# Altium footprint library ZYF_IC.PcbLib: 32 footprints (part 2 of 2)
Each footprint in its own frame and in the unit in brackets; x right, y up, seen from the top. Pads: shape width x height; smd on the part's side, far side on the other; paste and mask are expansions set on the pad; w line width, h text height; cw(c..) or ccw(c..) is an arc to the next point about the centre after c.
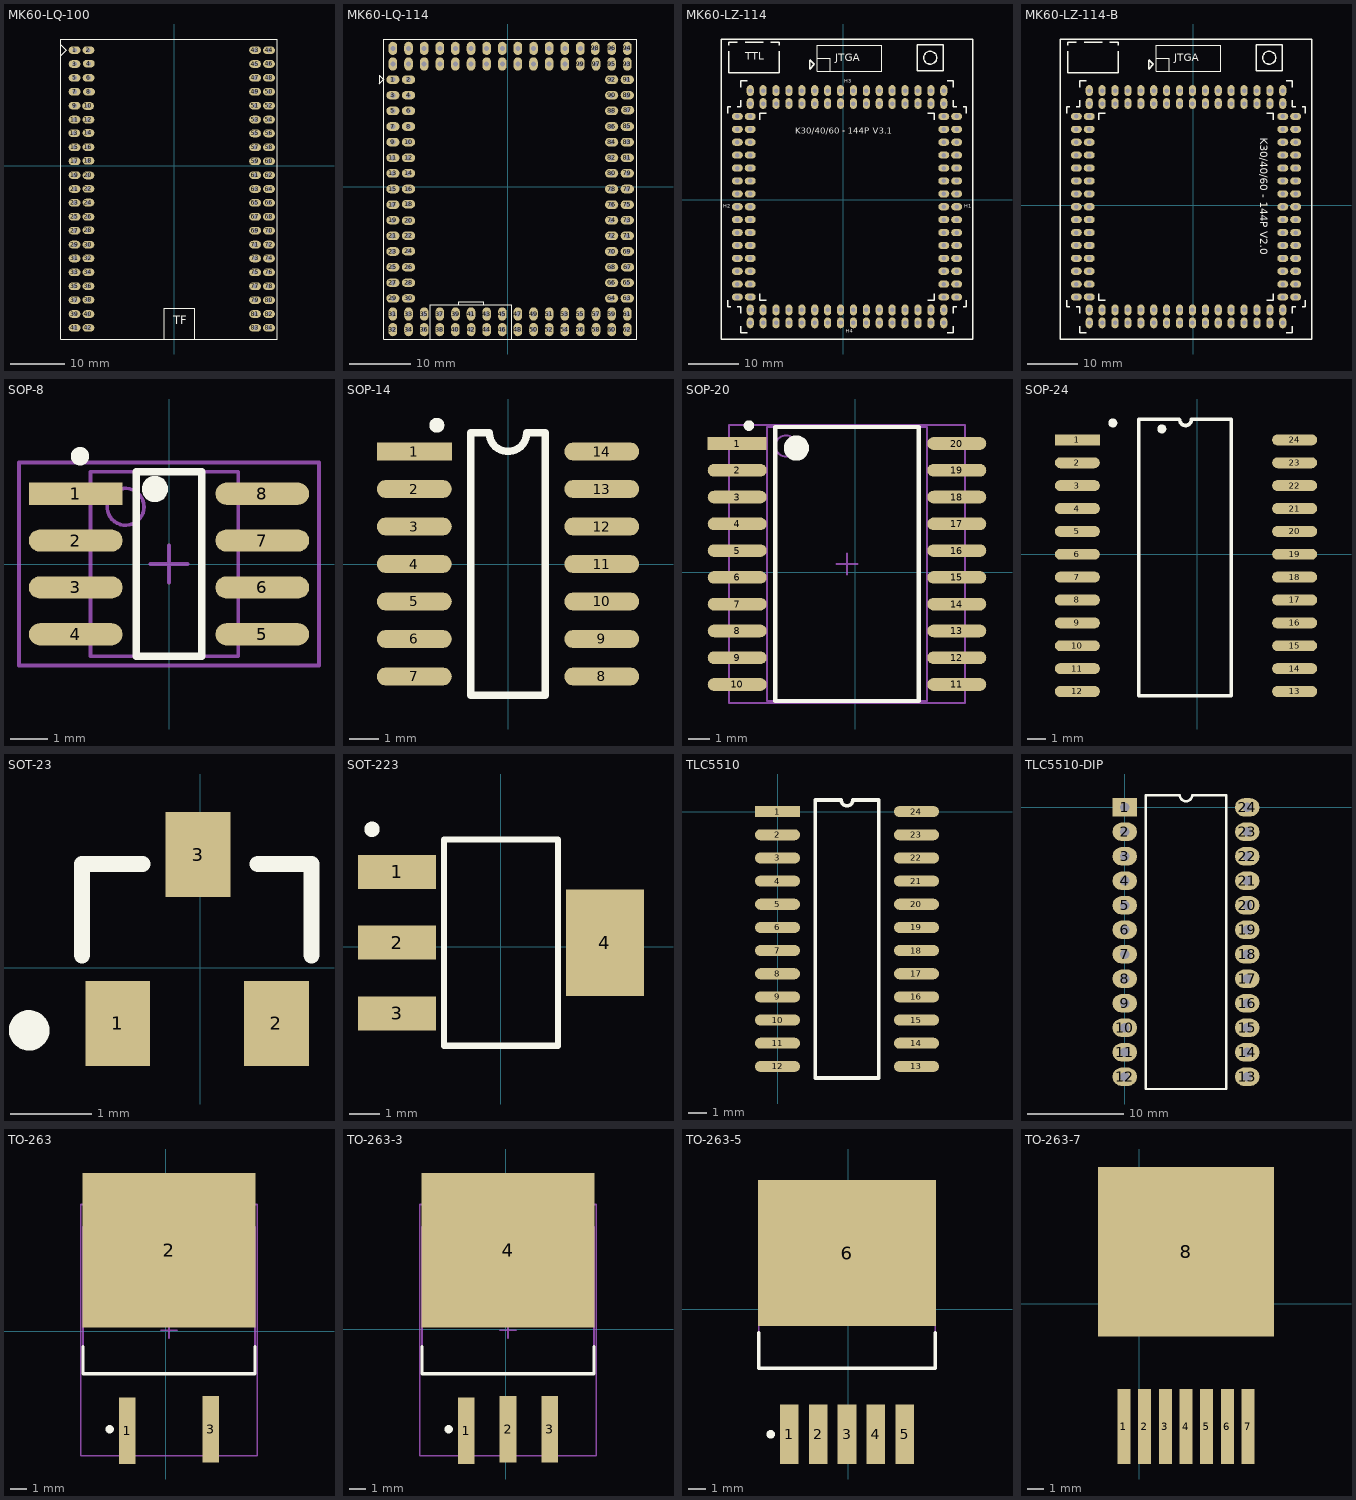
[diagram p1: the footprints below, top view; thin cyan lines are the x and y axes]

## MK60-LQ-100 [mil]
pads (84):
  oval 85x55 hole 32.28: 1(-717,832) 2(-617,832) 3(-717,732) 4(-614.24,734.76) 5(-717,632) 6(-616.21,632.39) 7(-717,532) 8(-613.06,531.21) 9(-717,432) 10(-619.36,429.64) 11(-717,332) 12(-617,331.21) 13(-718.97,234.36) 14(-617,235.54) 15(-717,132) 16(-617,133.57) 17(-717,32) 18(-617,35.15) 19(-717,-68) 20(-617,-70.36) 21(-717,-168) 22(-617,-166.82) 23(-717,-268) 24(-617,-265.64) 25(-717,-368) 26(-617,-368.39) 27(-717,-468) 28(-617,-464.46) 29(-717,-568) 30(-617,-568.39) 31(-717,-668) 32(-617,-667.61) 33(-717,-768) 34(-617,-766.82) 35(-717,-868) 36(-617,-867.61) 37(-717,-968) 38(-617,-966.43) 39(-717,-1068) 40(-617,-1068.39) 41(-717,-1168) 42(-617,-1167.61) 43(583,832) 44(683,830.43) 45(583,732) 46(683,732.39) 47(583,632) 48(683,632) 49(583,532) 50(683,532) 51(583,432) 52(683,432) 53(583,332) 54(683,332) 55(583,232) 56(683,232) 57(583,132) 58(683,132) 59(583,32) 60(683,32) 61(583,-68) 62(683,-68) 63(583,-168) 64(683,-168) 65(583,-268) 66(683,-268) 67(583,-368) 68(683,-368) 69(583,-468) 70(683,-468) 71(583,-568) 72(683,-568) 73(583,-668) 74(683,-668) 75(583,-768) 76(683,-768) 77(583,-868) 78(683,-868) 79(583,-968) 80(683,-968) 81(583,-1068) 82(683,-1068) 83(583,-1168) 84(683,-1168)
Top Overlay:
  lines w7.87: -817,792 -777,832 -817,872 ; -72,-1248 -72,-1028 148,-1028 148,-1248 ; -817,-1248 -817,912 743,912 743,-1248 -817,-1248
  text "TF" at -7,-1143 h60
3D body: height 334.65, standoff -125.98, extent 529.58,-1222.93 726.43,886.91
3D body: height 334.65, standoff -125.98, extent -765.42,-1217.93 -568.57,891.92

## MK60-LQ-114 [mil]
pads (124):
  oval 85x55 hole 32: 1(-734,687) 2(-634,687) 3(-734,587) 4(-634,587) 5(-734,487) 6(-634,487) 7(-734,387) 8(-634,387) 9(-734,287) 10(-634,287) 11(-734,187) 12(-634,186.21) 13(-734,87) 14(-634,87) 15(-734,-13) 16(-634,-13) 17(-734,-113) 18(-634,-109.85) 19(-734,-213) 20(-634,-215.36) 21(-734,-313) 22(-634,-311.82) 23(-734,-413) 24(-634,-410.64) 25(-734,-513) 26(-634,-513.39) 27(-734,-613) 28(-634,-613) 29(-734,-713) 30(-634,-713.39) 63(766,-713) 64(666,-713) 65(766,-613) 66(666,-613) 67(767.97,-513) 68(666,-513) 69(766,-413) 70(666,-413) 71(766,-313) 72(666,-313) 73(766,-213) 74(666,-213) 75(766,-113) 76(666,-113) 77(766,-13) 78(666,-13) 79(766,87) 80(666,87) 81(766,187) 82(666,187) 83(766,287) 84(666,287) 85(766,387) 86(666,387) 87(768.36,492.12) 88(666,487) 89(766,587) 90(666,587) 91(766,687) 92(666,687)
  oval 55x85 hole 32: 31(-734,-813) 32(-734,-913) 33(-634,-813) 34(-634,-913) 35(-534,-813) 36(-534,-913) 37(-434,-813) 38(-434,-913) 39(-333.21,-813) 40(-334,-913) 41(-234,-813) 42(-233.61,-913) 43(-134,-813) 44(-134,-913) 45(-34,-813) 46(-34,-913) 47(66,-813) 48(66,-913) 49(166,-813) 50(166,-913) 51(266,-813) 52(266,-913) 53(366,-813) 54(366,-913) 55(466,-813) 56(466,-913) 57(566,-813) 58(566,-913) 59(666,-813) 60(666,-913) 61(766,-813) 62(766,-913) 93(766,787) 94(766,887) 95(666,787) 96(666,887) 97(566,787) 98(560.09,887) 99(466,787) 100(466,887) 101(366,787) 102(366,887) 103(266,787) 104(266,887) 105(165.61,787) 106(166.39,887) 107(66,787) 108(66,887) 109(-34,787) 110(-34,887) 111(-134,787) 112(-134,887) 113(-234,787) 114(-234,887) 115(-334,787) 116(-334,887) 117(-434,787) 118(-434,887) 119(-534,787) 120(-534,887) 121(-634,787) 122(-634,887) 123(-734,787) 124(-734,887)
Top Overlay:
  lines w5.91: -494,-973 -494,-753 26,-753 26,-973 ; -314,-753 -314,-733 -154,-733 -154,-753
  lines w7.87: -793.06,687.79 -820.61,715.35 -820.61,661.02 -793.06,688.18 ; -794,-973 -794,947 826,947 826,-973 -794,-973
3D body: height 334.65, standoff -125.98, extent -583.84,-966.43 626,-769.57
3D body: height 334.65, standoff -125.98, extent -583.84,748.57 626,945.43
3D body: height 334.65, standoff -125.98, extent 622.58,-962.93 819.43,946.92
3D body: height 334.65, standoff -125.98, extent -777.43,-962.84 -580.57,947

## MK60-LZ-114 [mil]
pads (124):
  oval 85x55 hole 35: 101(880,-755) 102(780,-755) 103(880,-655) 104(780,-655) 105(880,-555) 106(780,-555) 107(880,-455) 108(780,-455) 109(880,-355) 110(780,-355) 111(880,-255) 112(780,-255) 113(880,-155) 114(780,-155) 115(880,-55) 116(780,-55) 117(880,45) 118(780,45) 119(880,145) 120(780,145) 121(880,245) 122(780,245) 123(880,345) 124(780,345) 125(880,445) 126(780,445) 127(880,545) 128(780,545) 129(880,645) 130(780,645) 201(-720,-755) 202(-820,-755) 203(-720,-655) 204(-820,-655) 205(-720,-555) 206(-820,-555) 207(-720,-455) 208(-820,-455) 209(-720,-355) 210(-820,-355) 211(-720,-255) 212(-820,-255) 213(-720,-155) 214(-820,-155) 215(-720,-55) 216(-820,-55) 217(-720,45) 218(-820,45) 219(-720,145) 220(-820,145) 221(-720,245) 222(-820,245) 223(-720,345) 224(-820,345) 225(-720,445) 226(-820,445) 227(-720,545) 228(-820,545) 229(-720,645) 230(-820,645)
  oval 55x85 hole 35: 301(780,845) 302(780,745) 303(680,845) 304(680,745) 305(580,845) 306(580,745) 307(480,845) 308(480,745) 309(380,845) 310(380,745) 311(280,845) 312(280,745) 313(180,845) 314(180,745) 315(80,845) 316(80,745) 317(-20,845) 318(-20,745) 319(-120,845) 320(-120,745) 321(-220,845) 322(-220,745) 323(-320,845) 324(-320,745) 325(-420,845) 326(-420,745) 327(-520,845) 328(-520,745) 329(-620,845) 330(-620,745) 331(-720,845) 332(-720,745) 401(780,-855) 402(780,-955) 403(680,-855) 404(680,-955) 405(580,-855) 406(580,-955) 407(480,-855) 408(480,-955) 409(380,-855) 410(380,-955) 411(280,-855) 412(280,-955) 413(180,-855) 414(180,-955) 415(80,-855) 416(80,-955) 417(-20,-855) 418(-20,-955) 419(-120,-855) 420(-120,-955) 421(-220,-855) 422(-220,-955) 423(-320,-855) 424(-320,-955) 425(-420,-855) 426(-420,-955) 427(-520,-855) 428(-520,-955) 429(-620,-855) 430(-620,-955) 431(-720,-855) 432(-720,-955)
Top Overlay:
  circle w10: c675,1100 r50
  lines w7.87: -200,1095 -100,1095 -100,995 ; -200,995 -200,1195 300,1195 300,995 -200,995
  lines w10: -895,-780 -895,-830 -870,-830 ; -895,670 -895,720 -870,720 ; -886.85,1150 -886.85,982.2 -493.15,982.2 -493.15,1150 ; -886.85,1195 -886.85,1218.43 -820,1218.43 ; -820,-830 -795,-830 -795,-880 ; -820,720 -795,720 -795,770 ; -795,-980 -795,-1030 -745,-1030 ; -795,870 -795,920 -745,920 ; -760,1220 -620,1220 ; -645,-730 -645,-780 -595,-780 ; -645,620 -645,670 -595,670 ; -560,1218.43 -493.15,1218.43 -493.15,1195 ; -260,1080 -260,1010 -222.5,1047.5 -257.5,1082.5 ; 655,-780 705,-780 705,-730 ; 655,670 705,670 705,620 ; 805,-1030 855,-1030 855,-980 ; 805,920 855,920 855,870 ; 855,-880 855,-830 880,-830 ; 855,770 855,720 880,720 ; 930,-830 955,-830 955,-780 ; 930,720 955,720 955,670 ; -945,-1080 -945,-455 -945,1245 1005,1245 1005,-555 1005,-1080 -945,-1080 ; 575,1000 575,1200 775,1200 775,1000 575,1000
  text "V3.1" at 230,495 h80
  text "TTL" at -760,1065 h100
  text "H3" at 10,895 h50
  text "H2" at -930,-75 h50
  text "H4" at 20,-1045 h50
  text "H1" at 940,-75 h50
  text "JTGA" at -60,1055 h100
  text "K30/40/60 - 144P" at -370,495 h80

## MK60-LZ-114-B [mil]
pads (124):
  oval 55x85 hole 35: 1(694,-811) 2(694,-911) 3(594,-811) 4(594,-911) 5(494,-811) 6(494,-911) 7(394,-811) 8(394,-911) 9(294,-811) 10(294,-911) 11(194,-811) 12(194,-911) 13(94,-811) 14(94,-911) 15(-6,-811) 16(-6,-911) 17(-106,-811) 18(-106,-911) 19(-206,-811) 20(-206,-911) 21(-306,-811) 22(-306,-911) 23(-406,-811) 24(-406,-911) 25(-506,-811) 26(-506,-911) 27(-606,-811) 28(-606,-911) 29(-706,-811) 30(-706,-911) 31(-806,-811) 32(-806,-911) 63(-806,789) 64(-806,889) 65(-706,789) 66(-706,889) 67(-606,789) 68(-606,889) 69(-506,789) 70(-506,889) 71(-406,789) 72(-406,889) 73(-306,789) 74(-306,889) 75(-206,789) 76(-206,889) 77(-106,789) 78(-106,889) 79(-6,789) 80(-6,889) 81(94,789) 82(94,889) 83(194,789) 84(194,889) 85(294,789) 86(294,889) 87(394,789) 88(394,889) 89(494,789) 90(494,889) 91(594,789) 92(594,889) 93(694,789) 94(694,889)
  oval 85x55 hole 35: 33(-806,-711) 34(-906,-711) 35(-806,-611) 36(-906,-611) 37(-806,-511) 38(-906,-511) 39(-806,-411) 40(-906,-411) 41(-806,-311) 42(-906,-311) 43(-806,-211) 44(-906,-211) 45(-806,-111) 46(-906,-111) 47(-806,-11) 48(-906,-11) 49(-806,89) 50(-906,89) 51(-806,189) 52(-906,189) 53(-806,289) 54(-906,289) 55(-806,389) 56(-906,389) 57(-806,489) 58(-906,489) 59(-806,589) 60(-906,589) 61(-806,689) 62(-906,689) 95(694,689) 96(794,689) 97(694,589) 98(794,589) 99(694,489) 100(794,489) 101(694,389) 102(794,389) 103(694,289) 104(794,289) 105(694,189) 106(794,189) 107(694,89) 108(794,89) 109(694,-11) 110(794,-11) 111(694,-111) 112(794,-111) 113(694,-211) 114(794,-211) 115(694,-311) 116(794,-311) 117(694,-411) 118(794,-411) 119(694,-511) 120(794,-511) 121(694,-611) 122(794,-611) 123(694,-711) 124(794,-711)
Top Overlay:
  circle w10: c589,1144 r50
  lines w7.87: -286,1139 -186,1139 -186,1039 ; -286,1039 214,1039 214,1239 -286,1239 -286,1039
  lines w10: -981,-736 -981,-786 -956,-786 ; -981,714 -981,764 -956,764 ; -972.85,1194 -972.85,1026.2 -579.15,1026.2 -579.15,1194 ; -972.85,1239 -972.85,1262.43 -906,1262.43 ; -906,-786 -881,-786 -881,-836 ; -906,764 -881,764 -881,814 ; -881,-936 -881,-986 -831,-986 ; -881,914 -881,964 -831,964 ; -846,1264 -706,1264 ; -731,-686 -731,-736 -681,-736 ; -731,664 -731,714 -681,714 ; -646,1262.43 -579.15,1262.43 -579.15,1239 ; -346,1124 -346,1054 -308.5,1091.5 -343.5,1126.5 ; 569,-736 619,-736 619,-686 ; 569,714 619,714 619,664 ; 719,-986 769,-986 769,-936 ; 719,964 769,964 769,914 ; 769,-836 769,-786 794,-786 ; 769,814 769,764 794,764 ; 844,-786 869,-786 869,-736 ; 844,764 869,764 869,714 ; -1031,-1036 919,-1036 919,-511 919,1289 -1031,1289 -1031,-411 -1031,-1036 ; 489,1044 689,1044 689,1244 489,1244 489,1044
  text "K30/40/60 - 144P V2.0" at 499,524 h100
  text "JTGA" at -146,1099 h100

## SOP-8 [mm]
pads (8):
  rect 2.54x0.6 smd: 1(-2.527,1.905)
  oval 2.54x0.6 smd: 2(-2.527,0.635) 3(-2.527,-0.635) 4(-2.527,-1.905) 5(2.527,-1.905) 6(2.527,-0.635) 7(2.527,0.635) 8(2.527,1.905)
Top Overlay:
  circle w0.356: c-0.381,2.032 r0.178
  circle w0.25: c-2.411,2.921 r0.125
  lines w0.2: -0.889,-2.5 0.889,-2.5 0.889,2.5 -0.889,2.5 -0.889,-2.5
Mechanical 13:
  circle w0.1: c-1.177,1.55 r0.5
  lines w0.1: -2.127,-2.5 1.873,-2.5 1.873,2.5 -2.127,2.5 -2.127,-2.5
Mechanical 15:
  lines w0.1: -0.5,0 0.5,0 ; 0,-0.5 0,0.5 ; -4.064,-2.75 4.064,-2.75 4.064,2.75 -4.064,2.75 -4.064,-2.75
3D body: height 1.6, standoff 0, extent -3.021,-2.51 3.021,2.51

## SOP-14 [mil]
pads (14):
  rect 100x24 smd: 1(-125,150)
  oval 100x24 smd: 2(-125,100) 3(-125,50) 4(-125,0) 5(-125,-50) 6(-125,-100) 7(-125,-150) 8(125,-150) 9(125,-100) 10(125,-50) 11(125,0) 12(125,50) 13(125,100) 14(125,150)
Top Overlay:
  circle w10: c-95,185 r5
  lines w10: -50,-175 50,-175 50,175 25,175 cw(c0,175) -25,175 -50,175 -50,-175
3D body: height 43.31, standoff 0, extent -145.98,-203.15 141.42,198.43

## SOP-20 [mil]
pads (20):
  rect 110.24x23.62 smd: 1(-220,240)
  oval 110.24x23.62 smd: 2(-220,190) 3(-220,140) 4(-220,90) 5(-220,40) 6(-220,-10) 7(-220,-60) 8(-220,-110) 9(-220,-160) 10(-220,-210) 11(190,-210) 12(190,-160) 13(190,-110) 14(190,-60) 15(190,-10) 16(190,40) 17(190,90) 18(190,140) 19(190,190) 20(190,240)
Top Overlay:
  circle w23.62: c-109.49,231.54 r11.81
  circle w9.84: c-198.07,273.46 r4.92
  lines w7.87: -148.86,-240.91 118.86,-240.91 118.86,270.91 -148.86,270.91 -148.86,-240.91
Mechanical 13:
  circle w3.94: c-129.17,235.47 r19.68
  lines w3.94: -164.61,-240.91 134.61,-240.91 134.61,270.91 -164.61,270.91 -164.61,-240.91
Mechanical 15:
  lines w3.94: -34.69,15 4.69,15 ; -15,-4.68 -15,34.69 ; -235.47,-244.84 205.47,-244.84 205.47,274.84 -235.47,274.84 -235.47,-244.84
3D body: height 78.74, standoff 0, extent -174.45,-235 144.45,265

## SOP-24 [mil]
pads (24):
  rect 98.43x24 smd: 1(-262.5,250)
  oval 98.43x24 smd: 2(-262.5,200) 3(-262.5,150) 4(-262.5,100) 5(-262.5,50) 6(-262.5,0) 7(-262.5,-50) 8(-262.5,-100) 9(-262.5,-150) 10(-262.5,-200) 11(-262.5,-250) 12(-262.5,-300) 13(212.5,-300) 14(212.5,-250) 15(212.5,-200) 16(212.5,-150) 17(212.5,-100) 18(212.5,-50) 19(212.5,0) 20(212.5,50) 21(212.5,100) 22(212.5,150) 23(212.5,200) 24(212.5,250)
Top Overlay:
  circle w9.84: c-185,287 r4.92
  circle w9.84: c-77.92,274 r4.92
  lines w7.87: -40,295.2 -79.1,295.2 -128,295.2 -128,-309.53 74,-309.53 74,295.2 -13,295.2 ; -38.6,294 ccw(c-26,294) -13.4,294
3D body: height 80, standoff 6.26, extent -233.01,-334 179,284

## SOT-23 [mil]
pads (3):
  rect 31.5x41.34 smd: 1(-40,-27) 2(37,-27) 3(-1,55)
Top Overlay:
  circle w9.84: c-82.99,-30.35 r4.92
  lines w7.87: -57.4,6.06 -57.4,50.35 -28,50.35 ; 28,50.35 54,50.35 54,6.06
3D body: height 43.31, standoff 0, extent -60.05,-35 58.06,65.07

## SOT-223 [mm]
pads (4):
  rect 2.54x1.1 smd: 1(-3.375,2.427) 2(-3.375,0.127) 3(-3.375,-2.173)
  rect 2.54x3.45 smd: 4(3.375,0.127)
Top Overlay:
  circle w0.25: c-4.189,3.81 r0.125
  lines w0.2: -1.85,-3.223 1.85,-3.223 1.85,3.477 -1.85,3.477 -1.85,-3.223
3D body: height 1.66, standoff -0.02, extent -3.48,-3.123 3.48,3.377

## TLC5510 [mm]
pads (24):
  rect 2.5x0.61 smd: 1(0,0)
  oval 2.5x0.61 smd: 2(0,-1.28) 3(0,-2.56) 4(0,-3.84) 5(0,-5.12) 6(0,-6.4) 7(0,-7.68) 8(0,-8.96) 9(0,-10.24) 10(0,-11.52) 11(0,-12.8) 12(0,-14.08) 13(7.68,-14.08) 14(7.68,-12.8) 15(7.68,-11.52) 16(7.68,-10.24) 17(7.68,-8.96) 18(7.68,-7.68) 19(7.68,-6.4) 20(7.68,-5.12) 21(7.68,-3.84) 22(7.68,-2.56) 23(7.68,-1.28) 24(7.68,0)
Top Overlay:
  lines w0.2: 2.085,-14.72 5.595,-14.72 5.595,0.64 4.16,0.64 cw(c3.84,0.64) 3.52,0.64 2.085,0.64 2.085,-14.72

## TLC5510-DIP [mil]
pads (24):
  rect 100x75 hole 39: 1(0,0)
  oval 100x75 hole 39: 2(0,-100) 3(0,-200) 4(0,-300) 5(0,-400) 6(0,-500) 7(0,-600) 8(0,-700) 9(0,-800) 10(0,-900) 11(0,-1000) 12(0,-1100) 13(500,-1100) 14(500,-1000) 15(500,-900) 16(500,-800) 17(500,-700) 18(500,-600) 19(500,-500) 20(500,-400) 21(500,-300) 22(500,-200) 23(500,-100) 24(500,0)
Top Overlay:
  lines w10: 85,-1150 85,50 225,50 ccw(c250,50) 275,50 415,50 415,-1150 85,-1150

## TO-263 [mil]
pads (3):
  rect 39.37x158 smd: 1(-92.5,-237.5) 3(107.5,-233.72)
  rect 411.42x368 smd: 2(7.5,192.5)
Top Overlay:
  circle w9.84: c-133.84,-233.72 r4.92
  lines w7.87: -197.22,-36.87 -197.22,-101.83 212.22,-101.83 212.22,-36.87
Mechanical 13:
  lines w3.94: -197.22,-101.83 212.22,-101.83 212.22,248.17 -197.22,248.17 -197.22,-101.83
Mechanical 15:
  lines w3.94: -12.19,2.5 27.18,2.5 ; 7.5,-17.18 7.5,22.18 ; -203.13,-296.71 218.13,-296.71 218.13,301.71 -203.13,301.71 -203.13,-296.71
3D body: height 193.9, standoff -3.66, extent -194.99,-265.71 205.01,335.23

## TO-263-3 [mil]
pads (4):
  rect 39.37x158 smd: 1(-95,-242.5) 2(5,-238.72) 3(105,-238.72)
  rect 411.42x368 smd: 4(5,187.5)
Top Overlay:
  circle w9.84: c-136.34,-238.72 r4.92
  lines w7.87: -199.72,-41.87 -199.72,-106.83 209.72,-106.83 209.72,-41.87
Mechanical 13:
  lines w3.94: -199.72,-106.83 209.72,-106.83 209.72,243.17 -199.72,243.17 -199.72,-106.83
Mechanical 15:
  lines w3.94: -14.69,-2.5 24.68,-2.5 ; 5,-22.18 5,17.18 ; -205.63,-301.71 215.63,-301.71 215.63,296.71 -205.63,296.71 -205.63,-301.71
3D body: height 184.65, standoff 0, extent -195,-265.37 205,342.5

## TO-263-5 [mm]
pads (6):
  rect 1.1x3.5 smd: 1(-3.464,-7.384) 2(-1.764,-7.384) 3(-0.064,-7.384) 4(1.636,-7.384) 5(3.336,-7.384)
  rect 10.5x8.6 smd: 6(-0.064,3.31)
Top Overlay:
  circle w0.25: c-4.564,-7.384 r0.125
  lines w0.2: -5.263,-1.391 -5.263,-3.49 5.136,-3.49 5.136,-1.391
Mechanical 13:
  lines w0.1: -5.263,-3.49 5.136,-3.49 5.136,5.91 -5.263,5.91 -5.263,-3.49
Mechanical 15:
  lines w0.1: -0.564,-0.191 0.436,-0.191 ; -0.064,-0.69 -0.064,0.31
3D body: height 4.56, standoff 0, extent -5.144,-7.475 5.016,6.54

## TO-263-7 [mil]
pads (8):
  rect 31.5x181.1 smd: 1(-37.5,-297.5) 2(12.5,-297.5) 3(62.5,-297.5) 4(112.5,-297.5) 5(162.5,-297.5) 6(212.5,-297.5) 7(262.5,-297.5)
  rect 425.2x410 smd: 8(112.5,125)
3D body: height 175.3, standoff -13.67, extent -84.7,-333.47 309,283.47